# Altium footprint library IC_SMD_DUAL.PCBLIB: 179 footprints (part 3 of 12)
Each footprint in its own frame and in the unit in brackets; x right, y up, seen from the top. Pads: shape width x height; smd on the part's side, far side on the other; paste and mask are expansions set on the pad; w line width, h text height; cw(c..) or ccw(c..) is an arc to the next point about the centre after c.
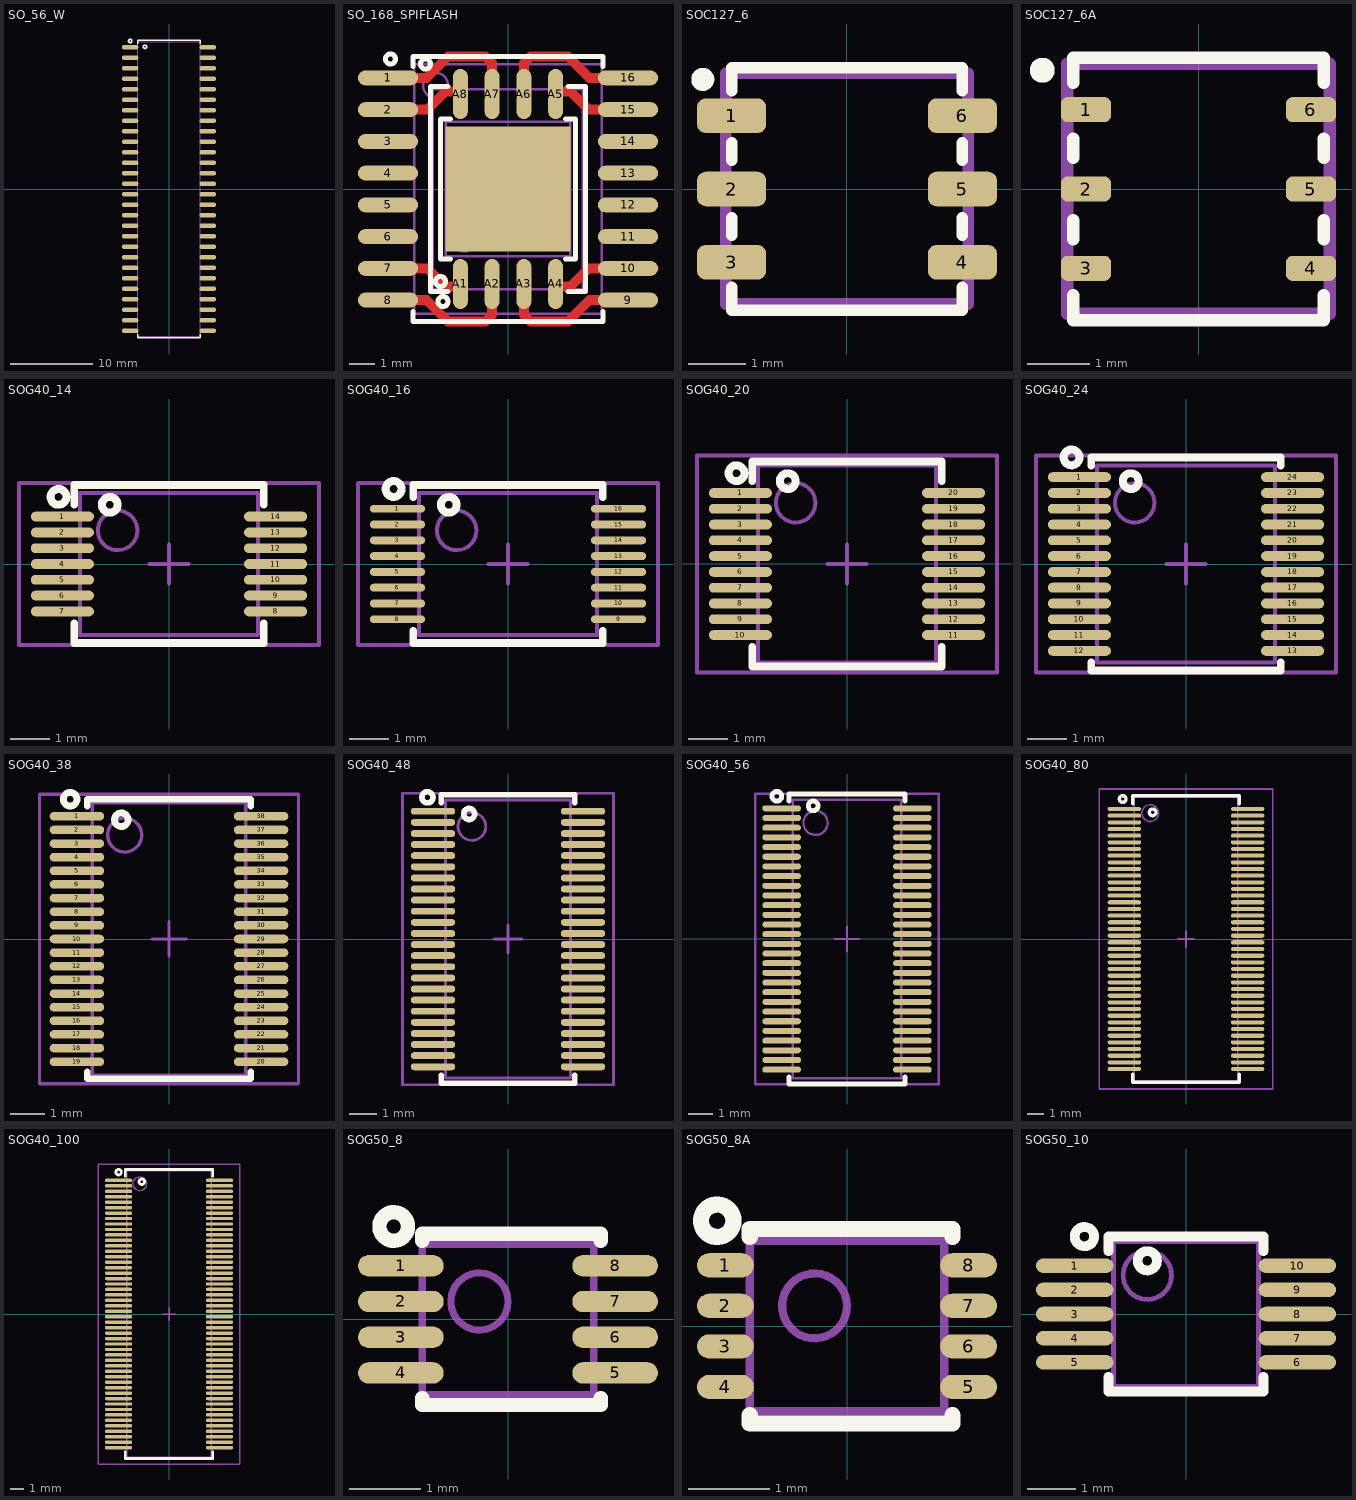
[diagram p2: the footprints below, top view; thin cyan lines are the x and y axes]

## SO_56_W [mm] "SOP, SOIC, 7.5mm width, 1.27mm pitch,"
pads (56):
  oval 2x0.6 smd: 1(-4.7,17.145) 2(-4.7,15.875) 3(-4.7,14.605) 4(-4.7,13.335) 5(-4.7,12.065) 6(-4.7,10.795) 7(-4.7,9.525) 8(-4.7,8.255) 9(-4.7,6.985) 10(-4.7,5.715) 11(-4.7,4.445) 12(-4.7,3.175) 13(-4.7,1.905) 14(-4.7,0.635) 15(-4.7,-0.635) 16(-4.7,-1.905) 17(-4.7,-3.175) 18(-4.7,-4.445) 19(-4.7,-5.715) 20(-4.7,-6.985) 21(-4.7,-8.255) 22(-4.7,-9.525) 23(-4.7,-10.795) 24(-4.7,-12.065) 25(-4.7,-13.335) 26(-4.7,-14.605) 27(-4.7,-15.875) 28(-4.7,-17.145) 29(4.7,-17.145) 30(4.7,-15.875) 31(4.7,-14.605) 32(4.7,-13.335) 33(4.7,-12.065) 34(4.7,-10.795) 35(4.7,-9.525) 36(4.7,-8.255) 37(4.7,-6.985) 38(4.7,-5.715) 39(4.7,-4.445) 40(4.7,-3.175) 41(4.7,-1.905) 42(4.7,-0.635) 43(4.7,0.635) 44(4.7,1.905) 45(4.7,3.175) 46(4.7,4.445) 47(4.7,5.715) 48(4.7,6.985) 49(4.7,8.255) 50(4.7,9.525) 51(4.7,10.795) 52(4.7,12.065) 53(4.7,13.335) 54(4.7,14.605) 55(4.7,15.875) 56(4.7,17.145)
TopOverlay:
  circle w0.2: c-2.9,17.2 r0.2
  circle w0.2: c-4.7,17.9 r0.2
  lines w0.2: -3.8,-17.6 -3.8,-18 3.8,-18 3.8,-17.6 ; -3.8,17.6 -3.8,18 3.8,18 3.8,17.6
Mechanical13:
  lines w0.1: -3.75,-17.8 3.75,-17.8 3.75,17.8 -3.75,17.8 -3.75,-17.8
3D body "SO_56_WW.step": height 2.65, standoff 0, extent -5.15,-17.5 5.15,17.5

## SO_168_SPIFLASH [mm] "SPI FLASH, footpirnt for SOP8W+SON8W+SOP16W"
pads (25):
  oval 2.4x0.6 smd: 1(-4.8,4.445) 2(-4.8,3.175) 3(-4.8,1.905) 4(-4.8,0.635) 5(-4.8,-0.635) 6(-4.8,-1.905) 7(-4.8,-3.175) 8(-4.8,-4.445) 9(4.8,-4.445) 10(4.8,-3.175) 11(4.8,-1.905) 12(4.8,-0.635) 13(4.8,0.635) 14(4.8,1.905) 15(4.8,3.175) 16(4.8,4.445)
  oval 0.6x2 smd: A1(-1.905,-3.8) A2(-0.635,-3.8) A3(0.635,-3.8) A4(1.905,-3.8) A5(1.905,3.8) A6(0.635,3.8) A7(-0.635,3.8) A8(-1.905,3.8)
  rect 5x5 smd: ""(0,0)
TopLayer:
  lines w0.4: -4.8,-4.445 -3.255,-4.445 -2.4,-5.3 -0.9,-5.3 -0.635,-5.035 -0.635,-4 ; -4.8,-3.175 -3.225,-3.175 -2.5,-3.9 -1.905,-3.9 ; -4.8,3.175 -3.225,3.175 -2.5,3.9 -1.905,3.9 ; -4.8,4.445 -3.255,4.445 -2.4,5.3 -0.9,5.3 -0.635,5.035 -0.635,4 ; 0.635,-4 0.635,-5.035 0.9,-5.3 2.4,-5.3 3.255,-4.445 4.8,-4.445 ; 0.635,4 0.635,5.035 0.9,5.3 2.4,5.3 3.255,4.445 4.8,4.445 ; 1.905,-3.9 2.5,-3.9 3.225,-3.175 4.8,-3.175 5.825,-3.175 ; 1.905,3.9 2.5,3.9 3.225,3.175 4.8,3.175
TopOverlay:
  circle w0.2: c-2.6,-4.5 r0.2
  circle w0.2: c-2.7,-3.7 r0.2
  circle w0.2: c-4.7,5.2 r0.2
  circle w0.2: c-3.3,5 r0.2
  lines w0.2: -3.8,-4.9 -3.8,-5.3 3.8,-5.3 3.8,-4.9 ; -3.8,4.9 -3.8,5.3 3.8,5.3 3.8,4.9 ; -2.4,-4.1 -3.1,-4.1 -3.1,4.1 -2.4,4.1 ; -2.3,-2.8 -2.7,-2.8 -2.7,2.8 -2.3,2.8 ; 2.3,-2.8 2.7,-2.8 2.7,2.8 2.3,2.8 ; 2.4,-4.1 3.1,-4.1 3.1,4.1 2.4,4.1
Mechanical13:
  circle w0.1: c-1.75,-2 r0.5
  circle w0.1: c-2.9,4.15 r0.5
  lines w0.1: -3.75,-5 -3.75,5 3.75,5 3.75,-5 -3.75,-5 ; -3,-4 3,-4 3,4 -3,4 -3,-4 ; -2.5,-2.7 2.5,-2.7 2.5,2.7 -2.5,2.7 -2.5,-2.7
3D body "User Library-SOIC16_Wide_JEDEC_MS-013AA.step": height 2.62, standoff -0.03, extent -5.215,-5.25 5.415,5.25
3D body "User Library-SOIC8_Wide_5mmx5mm.step": height 1.75, standoff -0.01, extent -2.73,-4.051 2.73,4.05
3D body "User Library-WSON-8_6x8mm.STEP": height 0.81, standoff -0.07, extent -3,-4 3,4

## SOC127_6 [mm] "TSOC-6, 1.27mm pitch, 4x4mm"
height 0.4
pads (6):
  rrect50% 1.2x0.6 smd: 1(-2,1.27) 2(-2,0) 3(-2,-1.27) 4(2,-1.27) 5(2,0) 6(2,1.27)
TopOverlay:
  circle w0.2: c-2.5,1.9 r0.1
  lines w0.2: -2,-1.7 -2,-2.1 2,-2.1 2,-1.7 ; -2,-0.8 -2,-0.5 ; -2,0.5 -2,0.8 ; -2,1.7 -2,2.1 2,2.1 2,1.7 ; 2,-0.8 2,-0.5 ; 2,0.5 2,0.8
Mechanical13:
  lines w0.2: -2.1,-1.993 -2.1,2.007 2.1,2.007 2.1,-1.993 -2.1,-1.993
3D body "User Library-TSOC6.STEP": height 1.4, standoff 0, extent -2.1,-1.993 2.1,2.007

## SOC127_6A [mm] "TSOC-6, 1.27mm pitch, 4x4mm"
height 0.4
pads (6):
  rrect50% 0.8x0.4 smd: 1(-1.8,1.27) 2(-1.8,0) 3(-1.8,-1.27) 4(1.8,-1.27) 5(1.8,0) 6(1.8,1.27)
TopOverlay:
  circle w0.2: c-2.5,1.9 r0.1
  lines w0.2: -2,-1.7 -2,-2.1 2,-2.1 2,-1.7 ; -2,-0.8 -2,-0.5 ; -2,0.5 -2,0.8 ; -2,1.7 -2,2.1 2,2.1 2,1.7 ; 2,-0.8 2,-0.5 ; 2,0.5 2,0.8
Mechanical13:
  lines w0.2: -2.1,-1.993 -2.1,2.007 2.1,2.007 2.1,-1.993 -2.1,-1.993
3D body "User Library-TSOC6.STEP": height 1.4, standoff 0, extent -2.1,-1.993 2.1,2.007

## SOG40_14 [mm]
height 1.2
pads (14):
  oval 1.6x0.25 smd mask+0.075: 1(-2.7,1.2) 2(-2.7,0.8) 3(-2.7,0.4) 4(-2.7,0) 5(-2.7,-0.4) 6(-2.7,-0.8) 7(-2.7,-1.2) 8(2.7,-1.2) 9(2.7,-0.8) 10(2.7,-0.4) 11(2.7,0) 12(2.7,0.4) 13(2.7,0.8) 14(2.7,1.2)
TopOverlay:
  circle w0.2: c-2.8,1.7 r0.2
  circle w0.2: c-1.5,1.5 r0.2
  lines w0.2: -2.4,-1.5 -2.4,-2 2.4,-2 2.4,-1.5 ; -2.4,1.5 -2.4,2 2.4,2 2.4,1.5
Mechanical13:
  circle w0.1: c-1.3,0.85 r0.5
  lines w0.1: -2.25,-1.8 2.25,-1.8 2.25,1.8 -2.25,1.8 -2.25,-1.8
Mechanical15:
  lines w0.1: -0.5,0 0.5,0 ; 0,-0.5 0,0.5 ; -3.8,-2.05 3.8,-2.05 3.8,2.05 -3.8,2.05 -3.8,-2.05
3D body "SOP127P600-8N.step": height 1.2, standoff 0, extent -3.2,-1.8 3.2,1.8

## SOG40_16 [mm] "DGV TVSOP-16 0.4mm pitch"
height 1.2
pads (16):
  oval 1.4x0.2 smd mask+0.05: 1(-2.8,1.4) 2(-2.8,1) 3(-2.8,0.6) 4(-2.8,0.2) 5(-2.8,-0.2) 6(-2.8,-0.6) 7(-2.8,-1) 8(-2.8,-1.4) 9(2.8,-1.4) 10(2.8,-1) 11(2.8,-0.6) 12(2.8,-0.2) 13(2.8,0.2) 14(2.8,0.6) 15(2.8,1) 16(2.8,1.4)
TopOverlay:
  circle w0.2: c-2.9,1.9 r0.2
  circle w0.2: c-1.5,1.5 r0.2
  lines w0.2: -2.4,-1.7 -2.4,-2 2.4,-2 2.4,-1.7 ; -2.4,1.7 -2.4,2 2.4,2 2.4,1.7
Mechanical13:
  circle w0.1: c-1.3,0.85 r0.5
  lines w0.1: -2.25,-1.8 2.25,-1.8 2.25,1.8 -2.25,1.8 -2.25,-1.8
Mechanical15:
  lines w0.1: -0.5,0 0.5,0 ; 0,-0.5 0,0.5 ; -3.8,-2.05 3.8,-2.05 3.8,2.05 -3.8,2.05 -3.8,-2.05
3D body "TSSOP40P640X120-16N.step": height 1.2, standoff 0, extent -3.2,-1.85 3.2,1.85

## SOG40_20 [mm] "DGV"
height 1.2
pads (20):
  oval 1.6x0.25 smd mask+0.075: 1(-2.7,1.8) 2(-2.7,1.4) 3(-2.7,1) 4(-2.7,0.6) 5(-2.7,0.2) 6(-2.7,-0.2) 7(-2.7,-0.6) 8(-2.7,-1) 9(-2.7,-1.4) 10(-2.7,-1.8) 11(2.7,-1.8) 12(2.7,-1.4) 13(2.7,-1) 14(2.7,-0.6) 15(2.7,-0.2) 16(2.7,0.2) 17(2.7,0.6) 18(2.7,1) 19(2.7,1.4) 20(2.7,1.8)
TopOverlay:
  circle w0.2: c-1.5,2.1 r0.2
  circle w0.2: c-2.8,2.3 r0.2
  lines w0.2: -2.4,-2.1 -2.4,-2.6 2.4,-2.6 2.4,-2.1 ; -2.4,2.1 -2.4,2.6 2.4,2.6 2.4,2.1
Mechanical13:
  circle w0.1: c-1.3,1.55 r0.5
  lines w0.1: -2.25,-2.5 -2.25,2.5 2.25,2.5 2.25,-2.5 -2.25,-2.5
Mechanical15:
  lines w0.1: -0.5,0 0.5,0 ; 0,-0.5 0,0.5 ; -3.8,-2.75 -3.8,2.75 3.8,2.75 3.8,-2.75 -3.8,-2.75
3D body: height 1.2, standoff 0.05, extent -2.25,-2.5 2.25,2.5

## SOG40_24 [mm] "DGV"
height 1.2
pads (24):
  oval 1.6x0.25 smd mask+0.075: 1(-2.7,2.2) 2(-2.7,1.8) 3(-2.7,1.4) 4(-2.7,1) 5(-2.7,0.6) 6(-2.7,0.2) 7(-2.7,-0.2) 8(-2.7,-0.6) 9(-2.7,-1) 10(-2.7,-1.4) 11(-2.7,-1.8) 12(-2.7,-2.2) 13(2.7,-2.2) 14(2.7,-1.8) 15(2.7,-1.4) 16(2.7,-1) 17(2.7,-0.6) 18(2.7,-0.2) 19(2.7,0.2) 20(2.7,0.6) 21(2.7,1) 22(2.7,1.4) 23(2.7,1.8) 24(2.7,2.2)
TopOverlay:
  circle w0.2: c-1.4,2.1 r0.2
  circle w0.2: c-2.9,2.7 r0.2
  lines w0.2: -2.4,-2.5 -2.4,-2.7 2.4,-2.7 2.4,-2.5 ; -2.4,2.5 -2.4,2.7 2.4,2.7 2.4,2.5
Mechanical13:
  circle w0.1: c-1.3,1.55 r0.5
  lines w0.1: -2.25,-2.5 -2.25,2.5 2.25,2.5 2.25,-2.5 -2.25,-2.5
Mechanical15:
  lines w0.1: -0.5,0 0.5,0 ; 0,-0.5 0,0.5 ; -3.8,-2.75 -3.8,2.75 3.8,2.75 3.8,-2.75 -3.8,-2.75
3D body: height 1.2, standoff 0.05, extent -2.25,-2.5 2.25,2.5

## SOG40_38 [mm]
height 1.2
pads (38):
  oval 1.6x0.25 smd mask+0.075: 1(-2.7,3.6) 2(-2.7,3.2) 3(-2.7,2.8) 4(-2.7,2.4) 5(-2.7,2) 6(-2.7,1.6) 7(-2.7,1.2) 8(-2.7,0.8) 9(-2.7,0.4) 10(-2.7,0) 11(-2.7,-0.4) 12(-2.7,-0.8) 13(-2.7,-1.2) 14(-2.7,-1.6) 15(-2.7,-2) 16(-2.7,-2.4) 17(-2.7,-2.8) 18(-2.7,-3.2) 19(-2.7,-3.6) 20(2.7,-3.6) 21(2.7,-3.2) 22(2.7,-2.8) 23(2.7,-2.4) 24(2.7,-2) 25(2.7,-1.6) 26(2.7,-1.2) 27(2.7,-0.8) 28(2.7,-0.4) 29(2.7,0) 30(2.7,0.4) 31(2.7,0.8) 32(2.7,1.2) 33(2.7,1.6) 34(2.7,2) 35(2.7,2.4) 36(2.7,2.8) 37(2.7,3.2) 38(2.7,3.6)
TopOverlay:
  circle w0.2: c-1.4,3.5 r0.2
  circle w0.2: c-2.9,4.1 r0.2
  lines w0.2: -2.4,-3.9 -2.4,-4.1 2.4,-4.1 2.4,-3.9 ; -2.4,3.9 -2.4,4.1 2.4,4.1 2.4,3.9
Mechanical13:
  circle w0.1: c-1.3,3.05 r0.5
  lines w0.1: -2.25,-4 2.25,-4 2.25,4 -2.25,4 -2.25,-4
Mechanical15:
  lines w0.1: -0.5,0 0.5,0 ; 0,-0.5 0,0.5 ; -3.8,-4.25 3.8,-4.25 3.8,4.25 -3.8,4.25 -3.8,-4.25
3D body: height 1.2, standoff 0.05, extent -2.25,-4 2.25,4

## SOG40_48 [mm]
height 1.2
pads (48):
  oval 1.6x0.25 smd mask+0.075: 1(-2.7,4.6) 2(-2.7,4.2) 3(-2.7,3.8) 4(-2.7,3.4) 5(-2.7,3) 6(-2.7,2.6) 7(-2.7,2.2) 8(-2.7,1.8) 9(-2.7,1.4) 10(-2.7,1) 11(-2.7,0.6) 12(-2.7,0.2) 13(-2.7,-0.2) 14(-2.7,-0.6) 15(-2.7,-1) 16(-2.7,-1.4) 17(-2.7,-1.8) 18(-2.7,-2.2) 19(-2.7,-2.6) 20(-2.7,-3) 21(-2.7,-3.4) 22(-2.7,-3.8) 23(-2.7,-4.2) 24(-2.7,-4.6) 25(2.7,-4.6) 26(2.7,-4.2) 27(2.7,-3.8) 28(2.7,-3.4) 29(2.7,-3) 30(2.7,-2.6) 31(2.7,-2.2) 32(2.7,-1.8) 33(2.7,-1.4) 34(2.7,-1) 35(2.7,-0.6) 36(2.7,-0.2) 37(2.7,0.2) 38(2.7,0.6) 39(2.7,1) 40(2.7,1.4) 41(2.7,1.8) 42(2.7,2.2) 43(2.7,2.6) 44(2.7,3) 45(2.7,3.4) 46(2.7,3.8) 47(2.7,4.2) 48(2.7,4.6)
TopOverlay:
  circle w0.2: c-1.4,4.5 r0.2
  circle w0.2: c-2.9,5.1 r0.2
  lines w0.2: -2.4,-4.9 -2.4,-5.2 2.4,-5.2 2.4,-4.9 ; -2.4,4.9 -2.4,5.2 2.4,5.2 2.4,4.9
Mechanical13:
  circle w0.1: c-1.3,4.05 r0.5
  lines w0.1: -2.25,-5 -2.25,5 2.25,5 2.25,-5 -2.25,-5
Mechanical15:
  lines w0.1: -0.5,0 0.5,0 ; 0,-0.5 0,0.5 ; -3.8,-5.25 -3.8,5.25 3.8,5.25 3.8,-5.25 -3.8,-5.25
3D body "SOP127P600-8N.step": height 1.1, standoff 0, extent -3.2,-4.9 3.2,4.9

## SOG40_56 [mm] "TSSOP, 56Lead, pitch: 0.5mm, 11.5x4.4x1.2mm"
height 1.2
pads (56):
  oval 1.6x0.25 smd mask+0.075: 1(-2.7,5.4) 2(-2.7,5) 3(-2.7,4.6) 4(-2.7,4.2) 5(-2.7,3.8) 6(-2.7,3.4) 7(-2.7,3) 8(-2.7,2.6) 9(-2.7,2.2) 10(-2.7,1.8) 11(-2.7,1.4) 12(-2.7,1) 13(-2.7,0.6) 14(-2.7,0.2) 15(-2.7,-0.2) 16(-2.7,-0.6) 17(-2.7,-1) 18(-2.7,-1.4) 19(-2.7,-1.8) 20(-2.7,-2.2) 21(-2.7,-2.6) 22(-2.7,-3) 23(-2.7,-3.4) 24(-2.7,-3.8) 25(-2.7,-4.2) 26(-2.7,-4.6) 27(-2.7,-5) 28(-2.7,-5.4) 29(2.7,-5.4) 30(2.7,-5) 31(2.7,-4.6) 32(2.7,-4.2) 33(2.7,-3.8) 34(2.7,-3.4) 35(2.7,-3) 36(2.7,-2.6) 37(2.7,-2.2) 38(2.7,-1.8) 39(2.7,-1.4) 40(2.7,-1) 41(2.7,-0.6) 42(2.7,-0.2) 43(2.7,0.2) 44(2.7,0.6) 45(2.7,1) 46(2.7,1.4) 47(2.7,1.8) 48(2.7,2.2) 49(2.7,2.6) 50(2.7,3) 51(2.7,3.4) 52(2.7,3.8) 53(2.7,4.2) 54(2.7,4.6) 55(2.7,5) 56(2.7,5.4)
TopOverlay:
  circle w0.2: c-2.9,5.9 r0.2
  circle w0.2: c-1.4,5.5 r0.2
  lines w0.2: -2.4,-5.7 -2.4,-6 2.4,-6 2.4,-5.7 ; -2.4,5.7 -2.4,6 2.4,6 2.4,5.7
Mechanical13:
  circle w0.1: c-1.3,4.8 r0.5
  lines w0.1: -2.25,-5.75 -2.25,5.75 2.25,5.75 2.25,-5.75 -2.25,-5.75
Mechanical15:
  lines w0.1: -0.5,0 0.5,0 ; 0,-0.5 0,0.5 ; -3.8,-6 -3.8,6 3.8,6 3.8,-6 -3.8,-6
3D body: height 1.2, standoff 0.05, extent -2.25,-5.75 2.25,5.75

## SOG40_80 [mm] "DBB TSSOP (TI), MO-153 (JEDEC), 80Lead, pitch: 0.4mm, 17x6.1x1.2mm"
height 1.2
pads (80):
  oval 2x0.25 smd mask+0.075: 1(-3.7,7.8) 2(-3.7,7.4) 3(-3.7,7) 4(-3.7,6.6) 5(-3.7,6.2) 6(-3.7,5.8) 7(-3.7,5.4) 8(-3.7,5) 9(-3.7,4.6) 10(-3.7,4.2) 11(-3.7,3.8) 12(-3.7,3.4) 13(-3.7,3) 14(-3.7,2.6) 15(-3.7,2.2) 16(-3.7,1.8) 17(-3.7,1.4) 18(-3.7,1) 19(-3.7,0.6) 20(-3.7,0.2) 21(-3.7,-0.2) 22(-3.7,-0.6) 23(-3.7,-1) 24(-3.7,-1.4) 25(-3.7,-1.8) 26(-3.7,-2.2) 27(-3.7,-2.6) 28(-3.7,-3) 29(-3.7,-3.4) 30(-3.7,-3.8) 31(-3.7,-4.2) 32(-3.7,-4.6) 33(-3.7,-5) 34(-3.7,-5.4) 35(-3.7,-5.8) 36(-3.7,-6.2) 37(-3.7,-6.6) 38(-3.7,-7) 39(-3.7,-7.4) 40(-3.7,-7.8) 41(3.7,-7.8) 42(3.7,-7.4) 43(3.7,-7) 44(3.7,-6.6) 45(3.7,-6.2) 46(3.7,-5.8) 47(3.7,-5.4) 48(3.7,-5) 49(3.7,-4.6) 50(3.7,-4.2) 51(3.7,-3.8) 52(3.7,-3.4) 53(3.7,-3) 54(3.7,-2.6) 55(3.7,-2.2) 56(3.7,-1.8) 57(3.7,-1.4) 58(3.7,-1) 59(3.7,-0.6) 60(3.7,-0.2) 61(3.7,0.2) 62(3.7,0.6) 63(3.7,1) 64(3.7,1.4) 65(3.7,1.8) 66(3.7,2.2) 67(3.7,2.6) 68(3.7,3) 69(3.7,3.4) 70(3.7,3.8) 71(3.7,4.2) 72(3.7,4.6) 73(3.7,5) 74(3.7,5.4) 75(3.7,5.8) 76(3.7,6.2) 77(3.7,6.6) 78(3.7,7) 79(3.7,7.4) 80(3.7,7.8)
TopOverlay:
  circle w0.2: c-2,7.6 r0.2
  circle w0.2: c-3.8,8.4 r0.2
  lines w0.2: -3.2,-8.1 -3.2,-8.6 3.2,-8.6 3.2,-8.1 ; -3.2,8.1 -3.2,8.6 3.2,8.6 3.2,8.1
Mechanical13:
  circle w0.1: c-2.15,7.55 r0.5
  lines w0.1: -3.1,-8.5 3.1,-8.5 3.1,8.5 -3.1,8.5 -3.1,-8.5
Mechanical15:
  lines w0.1: -0.5,0 0.5,0 ; 0,-0.5 0,0.5 ; -5.2,-9 5.2,-9 5.2,9 -5.2,9 -5.2,-9
3D body: height 1.2, standoff 0.05, extent -3.1,-8.5 3.1,8.5

## SOG40_100 [mm] "DBB TSSOP (TI), MO-153 (JEDEC), 100Lead, pitch: 0.4mm, 21x6.1x1.2mm"
height 1.2
pads (100):
  oval 2x0.25 smd mask+0.075: 1(-3.7,9.8) 2(-3.7,9.4) 3(-3.7,9) 4(-3.7,8.6) 5(-3.7,8.2) 6(-3.7,7.8) 7(-3.7,7.4) 8(-3.7,7) 9(-3.7,6.6) 10(-3.7,6.2) 11(-3.7,5.8) 12(-3.7,5.4) 13(-3.7,5) 14(-3.7,4.6) 15(-3.7,4.2) 16(-3.7,3.8) 17(-3.7,3.4) 18(-3.7,3) 19(-3.7,2.6) 20(-3.7,2.2) 21(-3.7,1.8) 22(-3.7,1.4) 23(-3.7,1) 24(-3.7,0.6) 25(-3.7,0.2) 26(-3.7,-0.2) 27(-3.7,-0.6) 28(-3.7,-1) 29(-3.7,-1.4) 30(-3.7,-1.8) 31(-3.7,-2.2) 32(-3.7,-2.6) 33(-3.7,-3) 34(-3.7,-3.4) 35(-3.7,-3.8) 36(-3.7,-4.2) 37(-3.7,-4.6) 38(-3.7,-5) 39(-3.7,-5.4) 40(-3.7,-5.8) 41(-3.7,-6.2) 42(-3.7,-6.6) 43(-3.7,-7) 44(-3.7,-7.4) 45(-3.7,-7.8) 46(-3.7,-8.2) 47(-3.7,-8.6) 48(-3.7,-9) 49(-3.7,-9.4) 50(-3.7,-9.8) 51(3.7,-9.8) 52(3.7,-9.4) 53(3.7,-9) 54(3.7,-8.6) 55(3.7,-8.2) 56(3.7,-7.8) 57(3.7,-7.4) 58(3.7,-7) 59(3.7,-6.6) 60(3.7,-6.2) 61(3.7,-5.8) 62(3.7,-5.4) 63(3.7,-5) 64(3.7,-4.6) 65(3.7,-4.2) 66(3.7,-3.8) 67(3.7,-3.4) 68(3.7,-3) 69(3.7,-2.6) 70(3.7,-2.2) 71(3.7,-1.8) 72(3.7,-1.4) 73(3.7,-1) 74(3.7,-0.6) 75(3.7,-0.2) 76(3.7,0.2) 77(3.7,0.6) 78(3.7,1) 79(3.7,1.4) 80(3.7,1.8) 81(3.7,2.2) 82(3.7,2.6) 83(3.7,3) 84(3.7,3.4) 85(3.7,3.8) 86(3.7,4.2) 87(3.7,4.6) 88(3.7,5) 89(3.7,5.4) 90(3.7,5.8) 91(3.7,6.2) 92(3.7,6.6) 93(3.7,7) 94(3.7,7.4) 95(3.7,7.8) 96(3.7,8.2) 97(3.7,8.6) 98(3.7,9) 99(3.7,9.4) 100(3.7,9.8)
TopOverlay:
  circle w0.2: c-2,9.7 r0.2
  circle w0.2: c-3.7,10.4 r0.2
  lines w0.2: -3.2,-10.1 -3.2,-10.6 3.2,-10.6 3.2,-10.1 ; -3.2,10.1 -3.2,10.6 3.2,10.6 3.2,10.1
Mechanical13:
  circle w0.1: c-2.15,9.55 r0.5
  lines w0.1: -3.1,-10.5 3.1,-10.5 3.1,10.5 -3.1,10.5 -3.1,-10.5
Mechanical15:
  lines w0.1: -0.5,0 0.5,0 ; 0,-0.5 0,0.5 ; -5.2,-11 5.2,-11 5.2,11 -5.2,11 -5.2,-11
3D body: height 1.2, standoff 0.05, extent -3.1,-10.5 3.1,10.5

## SOG50_8 [mm] "VSSOP DCU US8  (TI), 8-Leads, 2.00x2.30mm, Pitch 0.50mm"
height 0.9
pads (8):
  oval 1.2x0.3 smd mask+0.05: 1(-1.5,0.75) 2(-1.5,0.25) 3(-1.5,-0.25) 4(-1.5,-0.75) 5(1.5,-0.75) 6(1.5,-0.25) 7(1.5,0.25) 8(1.5,0.75)
TopOverlay:
  circle w0.2: c-1.6,1.3 r0.2
  lines w0.2: -1.2,-1.1 -1.2,-1.2 1.3,-1.2 1.3,-1.1 ; -1.2,1.1 -1.2,1.2 1.3,1.2 1.3,1.1
Mechanical13:
  circle w0.1: c-0.4,0.25 r0.4
  lines w0.1: -1.2,-1.05 -1.2,1.05 1.2,1.05 1.2,-1.05 -1.2,-1.05
3D body "User Library-SOP50P310X90-8N[8US8_VSSOP_DCU_MO-187CA].step": height 0.9, standoff 0, extent -1.6,-1.05 1.6,1.05

## SOG50_8A [mm] "VSSOP DCU US8  (TI), 8-Leads, 2.00x2.30mm, Pitch 0.50mm"
height 0.9
pads (8):
  oval 0.7x0.3 smd mask+0.05: 1(-1.5,0.75) 2(-1.5,0.25) 3(-1.5,-0.25) 4(-1.5,-0.75) 5(1.5,-0.75) 6(1.5,-0.25) 7(1.5,0.25) 8(1.5,0.75)
TopOverlay:
  circle w0.2: c-1.6,1.3 r0.2
  lines w0.2: -1.2,-1.1 -1.2,-1.2 1.3,-1.2 1.3,-1.1 ; -1.2,1.1 -1.2,1.2 1.3,1.2 1.3,1.1
Mechanical13:
  circle w0.1: c-0.4,0.25 r0.4
  lines w0.1: -1.2,-1.05 -1.2,1.05 1.2,1.05 1.2,-1.05 -1.2,-1.05
3D body "User Library-SOP50P310X90-8N[8US8_VSSOP_DCU_MO-187CA].step": height 0.9, standoff 0, extent -1.6,-1.05 1.6,1.05

## SOG50_10 [mm] "MSSOP10, 3X3mm 0.5mm pitch, DGS, MSOP10, 10uSOP/usop10 (Dallas), MO-187BA(JEDEC)"
pads (10):
  oval 1.6x0.3 smd mask+0.075: 1(-2.3,1) 2(-2.3,0.5) 3(-2.3,0) 4(-2.3,-0.5) 5(-2.3,-1) 6(2.3,-1) 7(2.3,-0.5) 8(2.3,0) 9(2.3,0.5) 10(2.3,1)
TopOverlay:
  circle w0.2: c-2.1,1.6 r0.2
  circle w0.2: c-0.8,1.1 r0.2
  lines w0.2: -1.6,-1.3 -1.6,-1.6 1.6,-1.6 1.6,-1.3 ; -1.6,1.3 -1.6,1.6 1.6,1.6 1.6,1.3
Mechanical13:
  circle w0.1: c-0.8,0.8 r0.5
  lines w0.1: -1.5,-1.5 -1.5,1.5 1.5,1.5 1.5,-1.5 -1.5,-1.5
3D body "User Library-MSOP-10-1.step": height 1.05, standoff 0, extent -2.514,-1.5 2.514,1.5